# Altium footprint library standard.PcbLib: 235 footprints (part 12 of 15)
Each footprint in its own frame and in the unit in brackets; x right, y up, seen from the top. Pads: shape width x height; smd on the part's side, far side on the other; paste and mask are expansions set on the pad; w line width, h text height; cw(c..) or ccw(c..) is an arc to the next point about the centre after c.
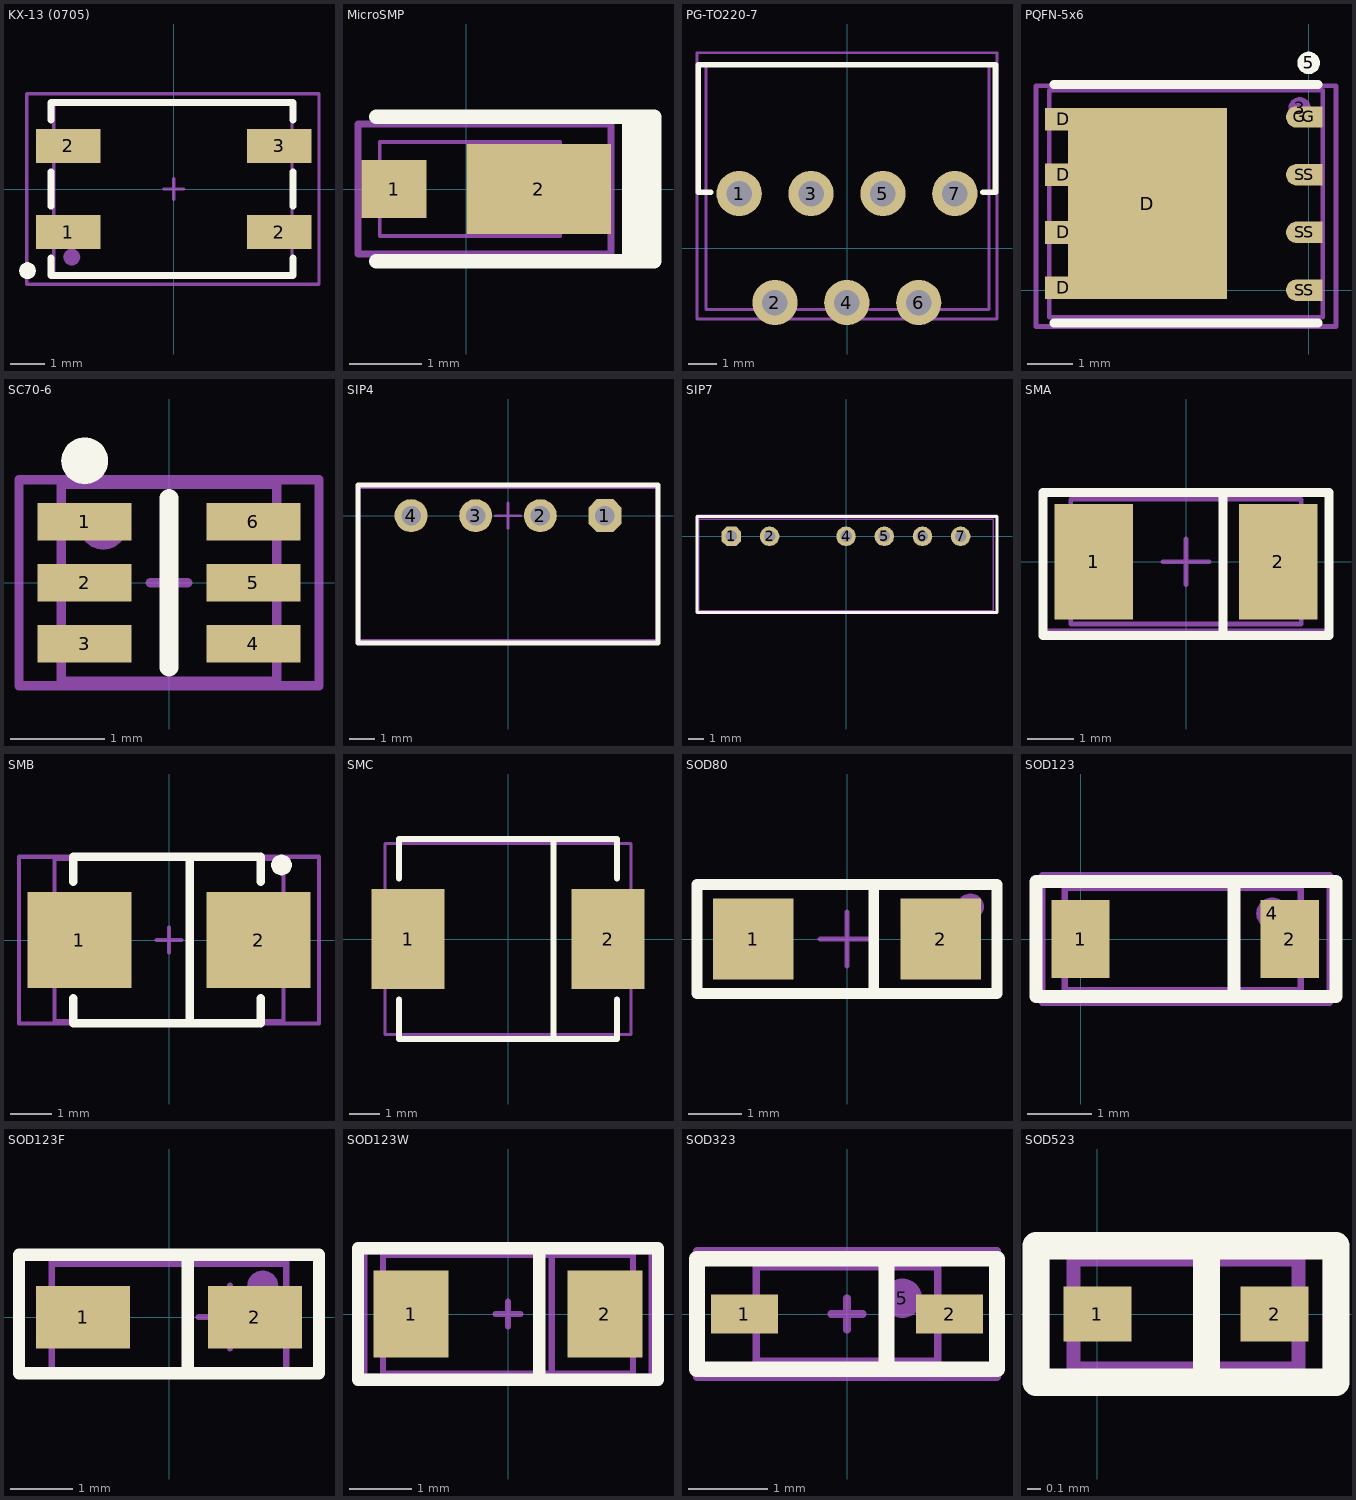
[diagram p11: the footprints below, top view; thin cyan lines are the x and y axes]

## KX-13 (0705) [mm]
height 1.2
pads (6):
  rect 1.9x1 smd: 1(-3.1,-1.27) 2(-3.1,1.27) 2(3.1,-1.27) 3(3.1,1.27)
  round 0.5 on Top Overlay: ""(-4.3,-2.4)
  round 0.5 on Mech1: ""(-3,-2)
Top Overlay:
  lines w0.2: -3.608,-2.032 -3.608,-2.54 3.504,-2.54 3.504,-2.032 ; -3.608,-0.508 -3.608,0.508 ; -3.608,2.032 -3.608,2.54 3.504,2.54 3.504,2.032 ; 3.504,-0.508 3.504,0.508
Mechanical 1:
  lines w0.1: -3.526,-2.5 3.474,-2.5 3.474,2.5 -3.526,2.5 -3.526,-2.5
Mechanical 15:
  lines w0.1: -0.3,0 0.3,0 ; 0,-0.3 0,-0.2 0,0.3 ; -4.318,-2.794 -4.318,2.794 4.266,2.794 4.266,-2.794 -4.318,-2.794
3D body "KX-13 QSMD7.0x5.0x1.3.step": height 1.3, standoff 0, extent -3.526,-2.5 3.474,2.5

## MicroSMP [mm] "Schottky Diode, 2-Leads, Body 2,2x1,3mm, 0.4W"
height 0.7
pads (3):
  rect 0.9x0.8 smd: 1(-1,0)
  rect 2x1.25 smd: 2(1,0)
  round 0.5 on Mech1: ""(0.9,0.3)
Top Overlay:
  rectangle: 2.15,-1 2.65,0.9
  lines w0.2: -1.25,-1 2.6,-1 2.6,1 -1.25,1
Mechanical 1:
  lines w0.05: -1.2,-0.65 -1.2,0.65 1.3,0.65 1.3,-0.65 -1.2,-0.65
Mechanical 15:
  lines w0.1: 0.85,0 1.85,0 ; 1.35,-0.5 1.35,0.5 ; -1.5,-0.9 -1.5,0.9 2,0.9 2,-0.9 -1.5,-0.9
3D body "MicroSMP-1.STEP": height 0.71, standoff 0.03, extent -1.21,-0.65 1.29,0.65

## PG-TO220-7 [mm] "5-Lead Plastic TO-220"
height 20
pads (7):
  round 1.6 hole 0.9: 1(-3.81,1.925) 2(-2.545,-1.925) 3(-1.27,1.925) 4(-0.005,-1.925) 5(1.27,1.925) 6(2.535,-1.925) 7(3.81,1.925)
Top Overlay:
  lines w0.2: -4.818,1.975 -5.255,1.975 -5.255,6.475 5.245,6.475 5.245,1.975 4.807,1.975
Mechanical 1:
  lines w0.1: -4.98,-2.175 5.02,-2.175 5.02,6.475 -4.98,6.475 -4.98,-2.175
Mechanical 15:
  lines w0.1: -5.3,-2.5 5.3,-2.5 5.3,6.9 -5.3,6.9 -5.3,-2.5
3D body "PG-TO220-7-1.STEP": height 19.95, standoff -1.3, extent -4.98,-2.175 5.02,6.475

## PQFN-5x6 [mm]
pads (15):
  round 0.5 on Mech1: 3(-0.2,4)
  round 0.5 on Top Overlay: 5(0,5)
  rrect0% 0.8x0.5 smd: D(-5.4,0.05) D(-5.4,1.27) D(-5.4,2.54) D(-5.4,3.76)
  rect 3.5x4.21 smd: D(-3.55,1.905)
  oval 0.6x0.47 smd: G(-0.2,3.81) S(-0.2,0) S(-0.2,1.27) S(-0.2,2.54)
  rrect0% 0.6x0.47 smd: G(0,3.81) S(0,0) S(0,1.27) S(0,2.54)
Top Overlay:
  lines w0.2: -5.6,-0.725 0.2,-0.725 ; -5.6,4.525 0.2,4.525
Mechanical 1:
  lines w0.1: -5.71,-0.6 0.31,-0.6 0.31,4.4 -5.71,4.4 -5.71,-0.6
Mechanical 15:
  lines w0.1: -6,-0.8 0.6,-0.8 0.6,4.5 -6,4.5 -6,-0.8
3D body "User Library-PQFN 5x6.STEP": height 0.9, standoff 0, extent -5.71,-0.6 0.31,4.4

## SC70-6 [mm] "SOT23, 5-Leads, Body 2,90x2,80mm, Pitch 0,95mm, IPC Medium Density"
height 1.45
pads (8):
  rect 1x0.4 smd: 1(-0.9,0.65) 2(-0.9,0) 3(-0.9,-0.65) 4(0.9,-0.65) 5(0.9,0) 6(0.9,0.65)
  round 0.5 on Top Overlay: ""(-0.9,1.3)
  round 0.5 on Mech1: ""(-0.7,0.6)
Top Overlay:
  lines w0.2: 0,-0.9 0,0.9
Mechanical 1:
  lines w0.1: -1.15,-1.05 1.15,-1.05 1.15,1.05 -1.15,1.05 -1.15,-1.05
Mechanical 15:
  lines w0.1: -0.2,0 0.2,0 ; 0,-0.2 0,0.2 ; -1.6,-1.1 -1.6,1.1 1.6,1.1 1.6,-1.1 -1.6,-1.1
3D body "User Library-sot363.STEP": height 1, standoff 0, extent -1.15,-1.05 1.15,1.05

## SIP4 [mm]
height 15
pads (4):
  oct 1.3x1.3 hole 0.762: 1(3.81,0)
  round 1.3 hole 0.762: 2(1.27,0) 3(-1.27,0) 4(-3.81,0)
Top Overlay:
  lines w0.2: -5.9,-5 -5.9,1.2 5.9,1.2 5.9,-5 -5.9,-5
Mechanical 1:
  lines w0.1: -5.842,-4.9 -5.842,1.1 5.842,1.1 5.842,-4.9 -5.842,-4.9
Mechanical 15:
  lines w0.1: -0.5,0 0.5,0 ; 0,-0.5 0,0.5 ; -5.9,-5 5.9,-5 5.9,1.2 -5.9,1.2 -5.9,-5
3D body "P6AU.STEP": height 10, standoff -3, extent -5.84,-4.905 5.84,1.095

## SIP7 [mm]
height 15
pads (6):
  oct 1.3x1.3 hole 0.762: 1(-7.62,0)
  round 1.3 hole 0.762: 2(-5.08,0) 4(0,0) 5(2.54,0) 6(5.08,0) 7(7.62,0)
Top Overlay:
  lines w0.2: -9.906,-5.08 10.033,-5.08 10.033,1.3 -9.906,1.3 -9.906,-5.08
Mechanical 1:
  lines w0.1: -9.779,-4.953 9.779,-4.953 9.779,1.143 -9.779,1.143 -9.779,-4.953
Mechanical 15:
  lines w0.1: -0.5,0 0.5,0 ; 0,-0.5 0,0.5 ; -9.906,-5.08 -9.906,1.397 10.033,1.397 10.033,-5.08 -9.906,-5.08
3D body "SIP-7(124567).STEP": height 10, standoff -2.5, extent -9.72,-4.9 9.78,1.15

## SMA [mm]
pads (3):
  rect 1.7x2.5 smd: 1(-2,0) 2(2,0)
  round 0.5 on Mech1: ""(2,0.9)
Top Overlay:
  lines w0.2: 0.8,-1.6 0.8,1.5 ; -3.1,-1.6 -3.1,1.5 3.1,1.5 3.1,-1.6 -3.1,-1.6
Mechanical 1:
  lines w0.1: -2.5,-1.35 -2.5,1.35 2.5,1.35 2.5,-1.35 -2.5,-1.35
Mechanical 15:
  lines w0.1: -0.5,0 0.5,0 ; 0,-0.5 0,0.5 ; -3.1,-1.5 3.1,-1.5 3.1,1.5 -3.1,1.5 -3.1,-1.5
3D body "User Library-Diode Molded BodyDIOM5025X231N.STEP": height 2.28, standoff -0.03, extent -2.5,-1.35 2.5,1.35

## SMB [mm]
pads (3):
  rect 2.5x2.3 smd: 1(-2.15,0) 2(2.15,0)
  round 0.5 on Top Overlay: ""(2.7,1.8)
Top Overlay:
  lines w0.2: -2.3,-1.4 -2.3,-2 2.2,-2 2.2,-1.4 ; -2.3,1.4 -2.3,2 2.2,2 2.2,1.4 ; 0.5,-2 0.5,2
Mechanical 1:
  lines w0.1: 0.5,-1.95 0.5,1.95 ; -2.75,-1.95 -2.75,1.95 2.75,1.95 2.75,-1.95 -2.75,-1.95
Mechanical 15:
  lines w0.1: -0.3,0 0.3,0 ; 0,-0.3 0,0.3 ; -3.6,-2 3.6,-2 3.6,2 -3.6,2 -3.6,-2
3D body "User Library-DIOM5539X24.STEP": height 2.45, standoff 0.03, extent -2.75,-1.95 2.75,1.95

## SMC [mm]
pads (2):
  rect 2.4x3.3 smd: 1(-3.3,0) 2(3.3,0)
Top Overlay:
  lines w0.2: -3.6,-2 -3.6,-3.3 3.6,-3.3 3.6,-2 ; -3.6,2 -3.6,3.3 3.6,3.3 3.6,2 ; 1.5,-3.3 1.5,3.3
Mechanical 1:
  lines w0.1: 1.5,-3.15 1.5,3.15 ; -4.064,-3.15 -4.064,3.15 4.064,3.15 4.064,-3.15 -4.064,-3.15
3D body "User Library-DO-214AB(SMC).STEP": height 2.67, standoff 0.03, extent -4.064,-3.15 4.064,3.15

## SOD80 [mm]
height 2
pads (3):
  rect 1.5x1.5 smd: 1(-1.75,0) 2(1.75,0)
  round 0.5 on Mech1: ""(2.3,0.6)
Top Overlay:
  lines w0.2: 0.5,-1.016 0.5,1 ; -2.794,-1.016 2.794,-1.016 2.794,1.016 -2.794,1.016 -2.794,-1.016
Mechanical 1:
  lines w0.1: 0.5,-1.016 0.5,1.016 ; -2.794,-1.016 2.794,-1.016 2.794,1.016 -2.794,1.016 -2.794,-1.016
Mechanical 15:
  lines w0.1: -0.5,0 0.5,0 ; 0,-0.5 0,0.5 ; -2.794,-1.016 -2.794,1.016 2.794,1.016 2.794,-1.016 -2.794,-1.016
3D body "SOD80-2.step": height 1.52, standoff -0.02, extent -1.676,-0.777 1.677,0.762

## SOD123 [mm]
pads (3):
  rect 0.91x1.22 smd: 1(0,0) 2(3.275,0)
  round 0.5 on Mech1: 4(3,0.4)
Top Overlay:
  lines w0.2: 2.4,-0.9 2.4,0.9 ; -0.7,-0.9 -0.7,0.9 4,0.9 4,-0.9 -0.7,-0.9
Mechanical 1:
  lines w0.1: -0.249,-0.8 -0.249,0.8 3.449,0.8 3.449,-0.8 -0.249,-0.8
Mechanical 15:
  lines w0.1: -0.6,-1 -0.6,1 3.9,1 3.9,-1 -0.6,-1
3D body "User Library-SOD-123.STEP": height 1.25, standoff 0, extent -0.249,-0.8 3.449,0.8

## SOD123F [mm] "Schottky Diode, 2-Leads, Body 3x2mm, 0.4W"
height 1
pads (3):
  rect 1.5x1 smd: 1(-1.375,0) 2(1.375,0)
  round 0.5 on Mech1: ""(1.5,0.5)
Top Overlay:
  lines w0.2: 0.3,-0.9 0.3,1 ; -2.4,-0.9 -2.4,1 2.3,1 2.4,1 2.4,-0.9 -2.4,-0.9
Mechanical 1:
  lines w0.1: -1.875,-0.85 1.875,-0.85 1.875,0.85 -1.875,0.85 -1.875,-0.85
Mechanical 15:
  lines w0.1: 0.475,0 1.475,0 ; 0.975,-0.5 0.975,0.5 ; -1.875,-0.9 1.875,-0.9 1.875,0.9 -1.875,0.9 -1.875,-0.9
3D body "SOD123F.STEP": height 1.23, standoff 0.02, extent -1.875,-0.85 1.875,0.85

## SOD123W [mm]
pads (2):
  rect 1.2x1.4 smd: 1(-1.55,0) 2(1.55,0)
Top Overlay:
  lines w0.2: 0.5,-1.05 0.5,1.05 ; -2.4,-1.05 -2.4,1.05 2.4,1.05 2.4,-1.05 -2.4,-1.05
Mechanical 1:
  lines w0.1: 0.7,-0.95 0.7,0.95 ; 2,-0.95 2,0.95 ; 2,-0.95 2,-0.95 ; 2,-0.95 -2,-0.95 -2,0.95 2,0.95 ; 2,0.95 2,0.95
Mechanical 15:
  lines w0.1: -0.2,0 0.2,0 ; 0,-0.2 0,0.2 ; -2.3,-1 2.3,-1 2.3,1 -2.3,1 -2.3,-1
3D body "User Library-SOD123W.STEP": height 1.1, standoff -0.01, extent -2,-0.95 2,0.95

## SOD323 [mm]
pads (3):
  rect 0.85x0.5 smd: 1(-1.3,0) 2(1.3,0)
  round 0.5 on Mech1: 5(0.7,0.2)
Top Overlay:
  lines w0.2: 0.5,-0.7 0.5,0.7 ; -1.9,-0.7 -1.9,0.7 1.9,0.7 1.9,-0.7 -1.9,-0.7
Mechanical 1:
  lines w0.1: -1.15,-0.6 1.15,-0.6 1.15,0.6 -1.15,0.6 -1.15,-0.6
Mechanical 15:
  lines w0.1: -0.2,0 0.2,0 ; 0,-0.2 0,0.2 ; -1.9,-0.8 -1.9,0.8 1.9,0.8 1.9,-0.8 -1.9,-0.8
3D body "User Library-1N4148WS.STEP": height 1.04, standoff -0.06, extent -1.15,-0.6 1.15,0.6

## SOD523 [mm]
pads (2):
  rect 0.5x0.4 smd: 1(0,0) 2(1.3,0)
Top Overlay:
  lines w0.2: 0.8,-0.4 0.8,0.5 ; -0.45,-0.5 1.75,-0.5 1.75,0.5 -0.45,0.5 -0.45,-0.5
Mechanical 1:
  lines w0.1: 0.8,-0.4 0.8,0.4 ; -0.175,-0.4 -0.175,0.4 1.4,0.4 1.475,0.4 1.475,-0.4 -0.175,-0.4
Mechanical 15:
  lines w0.1: -0.4,-0.5 1.7,-0.5 1.7,0.5 -0.4,0.5 -0.4,-0.5
3D body "User Library-SOD523-2.STEP": height 0.65, standoff 0, extent -0.175,-0.4 1.475,0.4